# Altium footprint library ref-packages-longpad.PCBLIB: 1527 footprints (part 43 of 103) (continued)
## PQFP52 [mm]
pads (52):
  rect 1.5x0.5 smd: 1(-8.5,6) 2(-8.5,5) 3(-8.5,4) 4(-8.5,3) 5(-8.5,2) 6(-8.5,1) 7(-8.5,0) 8(-8.5,-1) 9(-8.5,-2) 10(-8.5,-3) 11(-8.5,-4) 12(-8.5,-5) 13(-8.5,-6) 27(8.5,-6) 28(8.5,-5) 29(8.5,-4) 30(8.5,-3) 31(8.5,-2) 32(8.5,-1) 33(8.5,0) 34(8.5,1) 35(8.5,2) 36(8.5,3) 37(8.5,4) 38(8.5,5) 39(8.5,6)
  rect 0.5x1.5 smd: 14(-6,-8.5) 15(-5,-8.5) 16(-4,-8.5) 17(-3,-8.5) 18(-2,-8.5) 19(-1,-8.5) 20(0,-8.5) 21(1,-8.5) 22(2,-8.5) 23(3,-8.5) 24(4,-8.5) 25(5,-8.5) 26(6,-8.5) 40(6,8.5) 41(5,8.5) 42(4,8.5) 43(3,8.5) 44(2,8.5) 45(1,8.5) 46(0,8.5) 47(-1,8.5) 48(-2,8.5) 49(-3,8.5) 50(-4,8.5) 51(-5,8.5) 52(-6,8.5)
Top Overlay:
  circle w0.152: c-6,6 r0.5
  lines w0.051: -7,-6.5 -7,6.5 -6.5,7 6.5,7 7,6.5 7,-6.5 6.5,-7 -6.5,-7 -7,-6.5
  lines w0.152: -7.5,-6.5 -7.5,6.5 -6.5,7.5 6.5,7.5 7.5,6.5 7.5,-6.5 6.5,-7.5 -6.5,-7.5 -7.5,-6.5
Mechanical 16:
  rectangle: -9.25,5.75 -7.5,6.25
  rectangle: -9.25,4.75 -7.5,5.25
  rectangle: -9.25,3.75 -7.5,4.25
  rectangle: -9.25,2.75 -7.5,3.25
  rectangle: -9.25,1.75 -7.5,2.25
  rectangle: -9.25,0.75 -7.5,1.25
  rectangle: -9.25,-0.25 -7.5,0.25
  rectangle: -9.25,-1.25 -7.5,-0.75
  rectangle: -9.25,-2.25 -7.5,-1.75
  rectangle: -9.25,-3.25 -7.5,-2.75
  rectangle: -9.25,-4.25 -7.5,-3.75
  rectangle: -9.25,-5.25 -7.5,-4.75
  rectangle: -6.25,-9.25 -5.75,-7.5
  rectangle: -5.25,-9.25 -4.75,-7.5
  rectangle: -4.25,-9.25 -3.75,-7.5
  rectangle: -3.25,-9.25 -2.75,-7.5
  rectangle: -2.25,-9.25 -1.75,-7.5
  rectangle: -1.25,-9.25 -0.75,-7.5
  rectangle: -0.25,-9.25 0.25,-7.5
  rectangle: 0.75,-9.25 1.25,-7.5
  rectangle: 1.75,-9.25 2.25,-7.5
  rectangle: 2.75,-9.25 3.25,-7.5
  rectangle: 3.75,-9.25 4.25,-7.5
  rectangle: 4.75,-9.25 5.25,-7.5
  rectangle: 5.75,-9.25 6.25,-7.5
  rectangle: 7.5,-6.25 9.25,-5.75
  rectangle: 7.5,-5.25 9.25,-4.75
  rectangle: 7.5,-4.25 9.25,-3.75
  rectangle: 7.5,-3.25 9.25,-2.75
  rectangle: 7.5,-2.25 9.25,-1.75
  rectangle: 7.5,-1.25 9.25,-0.75
  rectangle: 7.5,-0.25 9.25,0.25
  rectangle: 7.5,0.75 9.25,1.25
  rectangle: 7.5,1.75 9.25,2.25
  rectangle: 7.5,2.75 9.25,3.25
  rectangle: 7.5,3.75 9.25,4.25
  rectangle: 7.5,4.75 9.25,5.25
  rectangle: 7.5,5.75 9.25,6.25
  rectangle: 4.75,7.5 5.25,9.25
  rectangle: 5.75,7.5 6.25,9.25
  rectangle: -1.25,7.5 -0.75,9.25
  rectangle: -0.25,7.5 0.25,9.25
  rectangle: 0.75,7.5 1.25,9.25
  rectangle: 1.75,7.5 2.25,9.25
  rectangle: 2.75,7.5 3.25,9.25
  rectangle: 3.75,7.5 4.25,9.25
  rectangle: -2.25,7.5 -1.75,9.25
  rectangle: -3.25,7.5 -2.75,9.25
  rectangle: -4.25,7.5 -3.75,9.25
  rectangle: -5.25,7.5 -4.75,9.25
  rectangle: -6.25,7.5 -5.75,9.25
  rectangle: -9.25,-6.25 -7.5,-5.75

## PQFP84 [mm]
pads (84):
  rect 0.35x1.8 smd: 1(-6.35,-9.4) 2(-5.715,-9.4) 3(-5.08,-9.4) 4(-4.445,-9.4) 5(-3.81,-9.4) 6(-3.175,-9.4) 7(-2.54,-9.4) 8(-1.905,-9.4) 9(-1.27,-9.4) 10(-0.635,-9.4) 11(0,-9.4) 12(0.635,-9.4) 13(1.27,-9.4) 14(1.905,-9.4) 15(2.54,-9.4) 16(3.175,-9.4) 17(3.81,-9.4) 18(4.445,-9.4) 19(5.08,-9.4) 20(5.715,-9.4) 21(6.35,-9.4) 43(6.35,9.4) 44(5.715,9.4) 45(5.08,9.4) 46(4.445,9.4) 47(3.81,9.4) 48(3.175,9.4) 49(2.54,9.4) 50(1.905,9.4) 51(1.27,9.4) 52(0.635,9.4) 53(0,9.4) 54(-0.635,9.4) 55(-1.27,9.4) 56(-1.905,9.4) 57(-2.54,9.4) 58(-3.175,9.4) 59(-3.81,9.4) 60(-4.445,9.4) 61(-5.08,9.4) 62(-5.715,9.4) 63(-6.35,9.4)
  rect 1.8x0.35 smd: 22(9.4,-6.35) 23(9.4,-5.715) 24(9.4,-5.08) 25(9.4,-4.445) 26(9.4,-3.81) 27(9.4,-3.175) 28(9.4,-2.54) 29(9.4,-1.905) 30(9.4,-1.27) 31(9.4,-0.635) 32(9.4,0) 33(9.4,0.635) 34(9.4,1.27) 35(9.4,1.905) 36(9.4,2.54) 37(9.4,3.175) 38(9.4,3.81) 39(9.4,4.445) 40(9.4,5.08) 41(9.4,5.715) 42(9.4,6.35) 64(-9.4,6.35) 65(-9.4,5.715) 66(-9.4,5.08) 67(-9.4,4.445) 68(-9.4,3.81) 69(-9.4,3.175) 70(-9.4,2.54) 71(-9.4,1.905) 72(-9.4,1.27) 73(-9.4,0.635) 74(-9.4,0) 75(-9.4,-0.635) 76(-9.4,-1.27) 77(-9.4,-1.905) 78(-9.4,-2.54) 79(-9.4,-3.175) 80(-9.4,-3.81) 81(-9.4,-4.445) 82(-9.4,-5.08) 83(-9.4,-5.715) 84(-9.4,-6.35)
Top Overlay:
  lines w0.203: -9.92,-8.382 -9.92,-9.144 -9.144,-9.906 ; -9.92,8.382 -9.92,9.144 ; -9.906,-8.382 -8.3,-7.112 -8.3,7.112 -9.906,8.382 ; -9.906,9.144 -9.144,9.92 -8.382,9.92 ; -9.144,-9.92 -8.382,-9.92 ; -8.382,-9.906 -7.112,-8.3 -6.776,-8.3 ; -8.382,9.906 -7.112,8.3 7.112,8.3 8.382,9.906 ; 6.985,-8.255 6.985,-7.62 -6.776,-7.62 -6.776,-8.3 ; 8.382,-9.92 9.144,-9.92 9.906,-9.144 ; 8.382,-9.906 7.112,-8.3 -6.776,-8.3 ; 8.382,9.92 9.144,9.92 ; 9.144,9.906 9.92,9.144 9.92,8.382 ; 9.906,-8.382 8.3,-7.112 8.3,7.112 9.906,8.382 ; 9.92,-9.144 9.92,-8.382
  text "1" at -6.61,-7.53 h1.97
Mechanical 16:
  drawing of 168 lines, arcs and shapes, not listed
Mechanical 27:
  lines w0.2: -10.9,-10.9 -10.9,10.9 10.9,10.9 10.9,-10.9 -10.9,-10.9

## PQFP100 [mm]
pads (100):
  rect 0.35x1.8 smd: 1(-7.62,-10.7) 2(-6.985,-10.7) 3(-6.35,-10.7) 4(-5.715,-10.7) 5(-5.08,-10.7) 6(-4.445,-10.7) 7(-3.81,-10.7) 8(-3.175,-10.7) 9(-2.54,-10.7) 10(-1.905,-10.7) 11(-1.27,-10.7) 12(-0.635,-10.7) 13(0,-10.7) 14(0.635,-10.7) 15(1.27,-10.7) 16(1.905,-10.7) 17(2.54,-10.7) 18(3.175,-10.7) 19(3.81,-10.7) 20(4.445,-10.7) 21(5.08,-10.7) 22(5.715,-10.7) 23(6.35,-10.7) 24(6.985,-10.7) 25(7.62,-10.7) 51(7.62,10.7) 52(6.985,10.7) 53(6.35,10.7) 54(5.715,10.7) 55(5.08,10.7) 56(4.445,10.7) 57(3.81,10.7) 58(3.175,10.7) 59(2.54,10.7) 60(1.905,10.7) 61(1.27,10.7) 62(0.635,10.7) 63(0,10.7) 64(-0.635,10.7) 65(-1.27,10.7) 66(-1.905,10.7) 67(-2.54,10.7) 68(-3.175,10.7) 69(-3.81,10.7) 70(-4.445,10.7) 71(-5.08,10.7) 72(-5.715,10.7) 73(-6.35,10.7) 74(-6.985,10.7) 75(-7.62,10.7)
  rect 1.8x0.35 smd: 26(10.7,-7.62) 27(10.7,-6.985) 28(10.7,-6.35) 29(10.7,-5.715) 30(10.7,-5.08) 31(10.7,-4.445) 32(10.7,-3.81) 33(10.7,-3.175) 34(10.7,-2.54) 35(10.7,-1.905) 36(10.7,-1.27) 37(10.7,-0.635) 38(10.7,0) 39(10.7,0.635) 40(10.7,1.27) 41(10.7,1.905) 42(10.7,2.54) 43(10.7,3.175) 44(10.7,3.81) 45(10.7,4.445) 46(10.7,5.08) 47(10.7,5.715) 48(10.7,6.35) 49(10.7,6.985) 50(10.7,7.62) 76(-10.7,7.62) 77(-10.7,6.985) 78(-10.7,6.35) 79(-10.7,5.715) 80(-10.7,5.08) 81(-10.7,4.445) 82(-10.7,3.81) 83(-10.7,3.175) 84(-10.7,2.54) 85(-10.7,1.905) 86(-10.7,1.27) 87(-10.7,0.635) 88(-10.7,0) 89(-10.7,-0.635) 90(-10.7,-1.27) 91(-10.7,-1.905) 92(-10.7,-2.54) 93(-10.7,-3.175) 94(-10.7,-3.81) 95(-10.7,-4.445) 96(-10.7,-5.08) 97(-10.7,-5.715) 98(-10.7,-6.35) 99(-10.7,-6.985) 100(-10.7,-7.62)
Top Overlay:
  lines w0.203: -11.22,9.652 -11.22,10.414 ; -11.206,9.652 -9.6,8.382 ; -11.206,10.414 -10.444,11.19 -9.682,11.19 ; -11.19,-9.682 -11.19,-10.444 -10.414,-11.206 ; -11.176,-9.682 -9.57,-8.412 ; -10.414,-11.22 -9.652,-11.22 ; -9.682,11.176 -8.412,9.57 ; -9.652,-11.206 -8.382,-9.6 -8.046,-9.6 ; -9.6,-8.382 -9.6,8.3 ; -8.382,9.6 8.3,9.6 ; 8.255,-9.555 8.255,-8.92 -8.046,-8.92 -8.046,-9.6 ; 8.382,-9.6 -8.046,-9.6 ; 8.382,9.6 9.652,11.206 ; 8.412,-9.57 9.682,-11.176 ; 9.57,8.412 11.176,9.682 ; 9.6,-8.382 11.206,-9.652 ; 9.6,-8.3 9.6,8.382 ; 9.652,11.22 10.414,11.22 ; 9.682,-11.19 10.444,-11.19 11.206,-10.414 ; 10.414,11.206 11.19,10.444 11.19,9.682 ; 11.22,-10.414 11.22,-9.652
  text "1" at -7.88,-8.83 h1.97
Mechanical 16:
  drawing of 200 lines, arcs and shapes, not listed
Mechanical 27:
  lines w0.2: -12.4,-12.4 -12.4,12.4 12.4,12.4 12.4,-12.4 -12.4,-12.4

## PQFP128L [mil]
pads (128):
  rect 9.84x62.99 smd: 1(-364.17,-338.58) 2(-344.49,-338.58) 3(-324.8,-338.58) 4(-305.12,-338.58) 5(-285.43,-338.58) 6(-265.75,-338.58) 7(-246.06,-338.58) 8(-226.38,-338.58) 9(-206.69,-338.58) 10(-187.01,-338.58) 11(-167.32,-338.58) 12(-147.64,-338.58) 13(-127.95,-338.58) 14(-108.27,-338.58) 15(-88.58,-338.58) 16(-68.9,-338.58) 17(-49.21,-338.58) 18(-29.53,-338.58) 19(-9.84,-338.58) 20(9.84,-338.58) 21(29.53,-338.58) 22(49.21,-338.58) 23(68.9,-338.58) 24(88.58,-338.58) 25(108.27,-338.58) 26(127.95,-338.58) 27(147.64,-338.58) 28(167.32,-338.58) 29(187.01,-338.58) 30(206.69,-338.58) 31(226.38,-338.58) 32(246.06,-338.58) 33(265.75,-338.58) 34(285.43,-338.58) 35(305.12,-338.58) 36(324.8,-338.58) 37(344.49,-338.58) 38(364.17,-338.58) 65(364.17,338.58) 66(344.49,338.58) 67(324.8,338.58) 68(305.12,338.58) 69(285.43,338.58) 70(265.75,338.58) 71(246.06,338.58) 72(226.38,338.58) 73(206.69,338.58) 74(187.01,338.58) 75(167.32,338.58) 76(147.64,338.58) 77(127.95,338.58) 78(108.27,338.58) 79(88.58,338.58) 80(68.9,338.58) 81(49.21,338.58) 82(29.53,338.58) 83(9.84,338.58) 84(-9.84,338.58) 85(-29.53,338.58) 86(-49.21,338.58) 87(-68.9,338.58) 88(-88.58,338.58) 89(-108.27,338.58) 90(-127.95,338.58) 91(-147.64,338.58) 92(-167.32,338.58) 93(-187.01,338.58) 94(-206.69,338.58) 95(-226.38,338.58) 96(-246.06,338.58) 97(-265.75,338.58) 98(-285.43,338.58) 99(-305.12,338.58) 100(-324.8,338.58) 101(-344.49,338.58) 102(-364.17,338.58)
  rect 62.99x9.84 smd: 39(456.69,-246.06) 40(456.69,-226.38) 41(456.69,-206.69) 42(456.69,-187.01) 43(456.69,-167.32) 44(456.69,-147.64) 45(456.69,-127.95) 46(456.69,-108.27) 47(456.69,-88.58) 48(456.69,-68.9) 49(456.69,-49.21) 50(456.69,-29.53) 51(456.69,-9.84) 52(456.69,9.84) 53(456.69,29.53) 54(456.69,49.21) 55(456.69,68.9) 56(456.69,88.58) 57(456.69,108.27) 58(456.69,127.95) 59(456.69,147.64) 60(456.69,167.32) 61(456.69,187.01) 62(456.69,206.69) 63(456.69,226.38) 64(456.69,246.06) 103(-456.69,246.06) 104(-456.69,226.38) 105(-456.69,206.69) 106(-456.69,187.01) 107(-456.69,167.32) 108(-456.69,147.64) 109(-456.69,127.95) 110(-456.69,108.27) 111(-456.69,88.58) 112(-456.69,68.9) 113(-456.69,49.21) 114(-456.69,29.53) 115(-456.69,9.84) 116(-456.69,-9.84) 117(-456.69,-29.53) 118(-456.69,-49.21) 119(-456.69,-68.9) 120(-456.69,-88.58) 121(-456.69,-108.27) 122(-456.69,-127.95) 123(-456.69,-147.64) 124(-456.69,-167.32) 125(-456.69,-187.01) 126(-456.69,-206.69) 127(-456.69,-226.38) 128(-456.69,-246.06)
Top Overlay:
  circle w10: c-336.61,-212.6 r29.52
  lines w8: -376.77,-258.27 376.38,-258.27 376.38,258.27 -376.77,258.27 -376.77,-258.27
Mechanical 16:
  rectangle: -368.11,-352.36 -360.24,-273.62
  rectangle: -348.43,-352.36 -340.55,-273.62
  rectangle: -328.74,-352.36 -320.87,-273.62
  rectangle: -309.06,-352.36 -301.18,-273.62
  rectangle: -289.37,-352.36 -281.5,-273.62
  rectangle: -269.69,-352.36 -261.81,-273.62
  rectangle: -250,-352.36 -242.13,-273.62
  rectangle: -230.32,-352.36 -222.44,-273.62
  rectangle: -210.63,-352.36 -202.76,-273.62
  rectangle: -190.94,-352.36 -183.07,-273.62
  rectangle: -171.26,-352.36 -163.39,-273.62
  rectangle: -151.57,-352.36 -143.7,-273.62
  rectangle: -131.89,-352.36 -124.02,-273.62
  rectangle: -112.2,-352.36 -104.33,-273.62
  rectangle: -92.52,-352.36 -84.65,-273.62
  rectangle: -72.83,-352.36 -64.96,-273.62
  rectangle: -53.15,-352.36 -45.28,-273.62
  rectangle: -33.46,-352.36 -25.59,-273.62
  rectangle: -13.78,-352.36 -5.91,-273.62
  rectangle: 5.91,-352.36 13.78,-273.62
  rectangle: 25.59,-352.36 33.46,-273.62
  rectangle: 45.28,-352.36 53.15,-273.62
  rectangle: 64.96,-352.36 72.83,-273.62
  rectangle: 84.65,-352.36 92.52,-273.62
  rectangle: 104.33,-352.36 112.2,-273.62
  rectangle: 124.02,-352.36 131.89,-273.62
  rectangle: 143.7,-352.36 151.57,-273.62
  rectangle: 163.39,-352.36 171.26,-273.62
  rectangle: 183.07,-352.36 190.94,-273.62
  rectangle: 202.76,-352.36 210.63,-273.62
  rectangle: 222.44,-352.36 230.32,-273.62
  rectangle: 242.13,-352.36 250,-273.62
  rectangle: 261.81,-352.36 269.69,-273.62
  rectangle: 281.5,-352.36 289.37,-273.62
  rectangle: 301.18,-352.36 309.06,-273.62
  rectangle: 320.87,-352.36 328.74,-273.62
  rectangle: 340.55,-352.36 348.43,-273.62
  rectangle: 360.24,-352.36 368.11,-273.62
  rectangle: 391.73,-250 470.47,-242.13
  rectangle: 391.73,-230.32 470.47,-222.44
  rectangle: 391.73,-210.63 470.47,-202.76
  rectangle: 391.73,-190.94 470.47,-183.07
  rectangle: 391.73,-171.26 470.47,-163.39
  rectangle: 391.73,-151.57 470.47,-143.7
  rectangle: 391.73,-131.89 470.47,-124.02
  rectangle: 391.73,-112.2 470.47,-104.33
  rectangle: 391.73,-92.52 470.47,-84.65
  rectangle: 391.73,-72.83 470.47,-64.96
  rectangle: 391.73,-53.15 470.47,-45.28
  rectangle: 391.73,-33.46 470.47,-25.59
  rectangle: 391.73,-13.78 470.47,-5.91
  rectangle: 391.73,5.91 470.47,13.78
  rectangle: 391.73,25.59 470.47,33.46
  rectangle: 391.73,45.28 470.47,53.15
  rectangle: 391.73,64.96 470.47,72.83
  rectangle: 391.73,84.65 470.47,92.52
  rectangle: 391.73,104.33 470.47,112.2
  rectangle: 391.73,124.02 470.47,131.89
  rectangle: 391.73,143.7 470.47,151.57
  rectangle: 391.73,163.39 470.47,171.26
  rectangle: 391.73,183.07 470.47,190.94
  rectangle: 391.73,202.76 470.47,210.63
  rectangle: 391.73,222.44 470.47,230.32
  rectangle: 391.73,242.13 470.47,250
  rectangle: 360.24,273.62 368.11,352.36
  rectangle: 340.55,273.62 348.43,352.36
  rectangle: 320.87,273.62 328.74,352.36
  rectangle: 301.18,273.62 309.06,352.36
  rectangle: 281.5,273.62 289.37,352.36
  rectangle: 261.81,273.62 269.69,352.36
  rectangle: 242.13,273.62 250,352.36
  rectangle: 222.44,273.62 230.32,352.36
  rectangle: 202.76,273.62 210.63,352.36
  rectangle: 183.07,273.62 190.94,352.36
  rectangle: 163.39,273.62 171.26,352.36
  rectangle: 143.7,273.62 151.57,352.36
  rectangle: 124.02,273.62 131.89,352.36
  rectangle: 104.33,273.62 112.2,352.36
  rectangle: 84.65,273.62 92.52,352.36
  rectangle: 64.96,273.62 72.83,352.36
  rectangle: 45.28,273.62 53.15,352.36
  rectangle: 25.59,273.62 33.46,352.36
  rectangle: 5.91,273.62 13.78,352.36
  rectangle: -13.78,273.62 -5.91,352.36
  rectangle: -33.46,273.62 -25.59,352.36
  rectangle: -53.15,273.62 -45.28,352.36
  rectangle: -72.83,273.62 -64.96,352.36
  rectangle: -92.52,273.62 -84.65,352.36
  rectangle: -112.2,273.62 -104.33,352.36
  rectangle: -131.89,273.62 -124.02,352.36
  rectangle: -151.57,273.62 -143.7,352.36
  rectangle: -171.26,273.62 -163.39,352.36
  rectangle: -190.94,273.62 -183.07,352.36
  rectangle: -210.63,273.62 -202.76,352.36
  rectangle: -230.32,273.62 -222.44,352.36
  rectangle: -250,273.62 -242.13,352.36
  rectangle: -269.69,273.62 -261.81,352.36
  rectangle: -289.37,273.62 -281.5,352.36
  rectangle: -309.06,273.62 -301.18,352.36
  rectangle: -328.74,273.62 -320.87,352.36
  rectangle: -348.43,273.62 -340.55,352.36
  rectangle: -368.11,273.62 -360.24,352.36
  rectangle: -470.47,242.13 -391.73,250
  rectangle: -470.47,222.44 -391.73,230.32
  rectangle: -470.47,202.76 -391.73,210.63
  rectangle: -470.47,183.07 -391.73,190.94
  rectangle: -470.47,163.39 -391.73,171.26
  rectangle: -470.47,143.7 -391.73,151.57
  rectangle: -470.47,124.02 -391.73,131.89
  rectangle: -470.47,104.33 -391.73,112.2
  rectangle: -470.47,84.65 -391.73,92.52
  rectangle: -470.47,64.96 -391.73,72.83
  rectangle: -470.47,45.28 -391.73,53.15
  rectangle: -470.47,25.59 -391.73,33.46
  rectangle: -470.47,5.91 -391.73,13.78
  rectangle: -470.47,-13.78 -391.73,-5.91
  rectangle: -470.47,-33.46 -391.73,-25.59
  rectangle: -470.47,-53.15 -391.73,-45.28
  rectangle: -470.47,-72.83 -391.73,-64.96
  rectangle: -470.47,-92.52 -391.73,-84.65
  rectangle: -470.47,-112.2 -391.73,-104.33
  rectangle: -470.47,-131.89 -391.73,-124.02
  rectangle: -470.47,-151.57 -391.73,-143.7
  rectangle: -470.47,-171.26 -391.73,-163.39
  rectangle: -470.47,-190.94 -391.73,-183.07
  rectangle: -470.47,-210.63 -391.73,-202.76
  rectangle: -470.47,-230.32 -391.73,-222.44
  rectangle: -470.47,-250 -391.73,-242.13
  lines w8: -389.76,-271.65 389.76,-271.65 389.76,271.65 -389.76,271.65 -389.76,-271.65

## PQFP132 [mm]
pads (132):
  rect 0.35x1.8 smd: 1(-10.16,-13.2) 2(-9.525,-13.2) 3(-8.89,-13.2) 4(-8.255,-13.2) 5(-7.62,-13.2) 6(-6.985,-13.2) 7(-6.35,-13.2) 8(-5.715,-13.2) 9(-5.08,-13.2) 10(-4.445,-13.2) 11(-3.81,-13.2) 12(-3.175,-13.2) 13(-2.54,-13.2) 14(-1.905,-13.2) 15(-1.27,-13.2) 16(-0.635,-13.2) 17(0,-13.2) 18(0.635,-13.2) 19(1.27,-13.2) 20(1.905,-13.2) 21(2.54,-13.2) 22(3.175,-13.2) 23(3.81,-13.2) 24(4.445,-13.2) 25(5.08,-13.2) 26(5.715,-13.2) 27(6.35,-13.2) 28(6.985,-13.2) 29(7.62,-13.2) 30(8.255,-13.2) 31(8.89,-13.2) 32(9.525,-13.2) 33(10.16,-13.2) 67(10.16,13.2) 68(9.525,13.2) 69(8.89,13.2) 70(8.255,13.2) 71(7.62,13.2) 72(6.985,13.2) 73(6.35,13.2) 74(5.715,13.2) 75(5.08,13.2) 76(4.445,13.2) 77(3.81,13.2) 78(3.175,13.2) 79(2.54,13.2) 80(1.905,13.2) 81(1.27,13.2) 82(0.635,13.2) 83(0,13.2) 84(-0.635,13.2) 85(-1.27,13.2) 86(-1.905,13.2) 87(-2.54,13.2) 88(-3.175,13.2) 89(-3.81,13.2) 90(-4.445,13.2) 91(-5.08,13.2) 92(-5.715,13.2) 93(-6.35,13.2) 94(-6.985,13.2) 95(-7.62,13.2) 96(-8.255,13.2) 97(-8.89,13.2) 98(-9.525,13.2) 99(-10.16,13.2)
  rect 1.8x0.35 smd: 34(13.2,-10.16) 35(13.2,-9.525) 36(13.2,-8.89) 37(13.2,-8.255) 38(13.2,-7.62) 39(13.2,-6.985) 40(13.2,-6.35) 41(13.2,-5.715) 42(13.2,-5.08) 43(13.2,-4.445) 44(13.2,-3.81) 45(13.2,-3.175) 46(13.2,-2.54) 47(13.2,-1.905) 48(13.2,-1.27) 49(13.2,-0.635) 50(13.2,0) 51(13.2,0.635) 52(13.2,1.27) 53(13.2,1.905) 54(13.2,2.54) 55(13.2,3.175) 56(13.2,3.81) 57(13.2,4.445) 58(13.2,5.08) 59(13.2,5.715) 60(13.2,6.35) 61(13.2,6.985) 62(13.2,7.62) 63(13.2,8.255) 64(13.2,8.89) 65(13.2,9.525) 66(13.2,10.16) 100(-13.2,10.16) 101(-13.2,9.525) 102(-13.2,8.89) 103(-13.2,8.255) 104(-13.2,7.62) 105(-13.2,6.985) 106(-13.2,6.35) 107(-13.2,5.715) 108(-13.2,5.08) 109(-13.2,4.445) 110(-13.2,3.81) 111(-13.2,3.175) 112(-13.2,2.54) 113(-13.2,1.905) 114(-13.2,1.27) 115(-13.2,0.635) 116(-13.2,0) 117(-13.2,-0.635) 118(-13.2,-1.27) 119(-13.2,-1.905) 120(-13.2,-2.54) 121(-13.2,-3.175) 122(-13.2,-3.81) 123(-13.2,-4.445) 124(-13.2,-5.08) 125(-13.2,-5.715) 126(-13.2,-6.35) 127(-13.2,-6.985) 128(-13.2,-7.62) 129(-13.2,-8.255) 130(-13.2,-8.89) 131(-13.2,-9.525) 132(-13.2,-10.16)
Top Overlay:
  lines w0.203: -13.76,12.152 -13.76,12.914 ; -13.746,12.152 -12.14,10.882 ; -13.746,12.914 -12.984,13.69 -12.222,13.69 ; -13.73,-12.182 -13.73,-12.944 -12.954,-13.706 ; -13.716,-12.182 -12.11,-10.912 ; -12.954,-13.72 -12.192,-13.72 ; -12.222,13.676 -10.952,12.07 ; -12.192,-13.706 -10.922,-12.1 -10.586,-12.1 ; -12.14,-10.962 -12.14,10.8 ; -10.962,12.14 10.8,12.14 ; 10.795,-12.055 10.795,-11.42 -10.586,-11.42 -10.586,-12.1 ; 10.882,12.14 12.152,13.746 ; 10.922,-12.1 -10.586,-12.1 ; 10.952,-12.07 12.222,-13.676 ; 12.07,10.952 13.676,12.222 ; 12.14,-10.882 13.746,-12.152 ; 12.14,-10.8 12.14,10.962 ; 12.152,13.76 12.914,13.76 ; 12.222,-13.69 12.984,-13.69 13.746,-12.914 ; 12.914,13.746 13.69,12.984 13.69,12.222 ; 13.76,-12.914 13.76,-12.152
  text "1" at -10.42,-11.33 h1.97
Mechanical 16:
  drawing of 264 lines, arcs and shapes, not listed
Mechanical 27:
  lines w0.2: -14.4,-14.4 -14.4,14.4 14.4,14.4 14.4,-14.4 -14.4,-14.4

## PQFP144 [mm]
pads (144):
  rect 1.2x0.35 smd: 1(-10.75,8.75) 2(-10.75,8.25) 3(-10.75,7.75) 4(-10.75,7.25) 5(-10.75,6.75) 6(-10.75,6.25) 7(-10.75,5.75) 8(-10.75,5.25) 9(-10.75,4.75) 10(-10.75,4.25) 11(-10.75,3.75) 12(-10.75,3.25) 13(-10.75,2.75) 14(-10.75,2.25) 15(-10.75,1.75) 16(-10.75,1.25) 17(-10.75,0.75) 18(-10.75,0.25) 19(-10.75,-0.25) 20(-10.75,-0.75) 21(-10.75,-1.25) 22(-10.75,-1.75) 23(-10.75,-2.25) 24(-10.75,-2.75) 25(-10.75,-3.25) 26(-10.75,-3.75) 27(-10.75,-4.25) 28(-10.75,-4.75) 29(-10.75,-5.25) 30(-10.75,-5.75) 31(-10.75,-6.25) 32(-10.75,-6.75) 33(-10.75,-7.25) 34(-10.75,-7.75) 35(-10.75,-8.25) 36(-10.75,-8.75) 73(10.75,-8.75) 74(10.75,-8.25) 75(10.75,-7.75) 76(10.75,-7.25) 77(10.75,-6.75) 78(10.75,-6.25) 79(10.75,-5.75) 80(10.75,-5.25) 81(10.75,-4.75) 82(10.75,-4.25) 83(10.75,-3.75) 84(10.75,-3.25) 85(10.75,-2.75) 86(10.75,-2.25) 87(10.75,-1.75) 88(10.75,-1.25) 89(10.75,-0.75) 90(10.75,-0.25) 91(10.75,0.25) 92(10.75,0.75) 93(10.75,1.25) 94(10.75,1.75) 95(10.75,2.25) 96(10.75,2.75) 97(10.75,3.25) 98(10.75,3.75) 99(10.75,4.25) 100(10.75,4.75) 101(10.75,5.25) 102(10.75,5.75) 103(10.75,6.25) 104(10.75,6.75) 105(10.75,7.25) 106(10.75,7.75) 107(10.75,8.25) 108(10.75,8.75)
  rect 0.35x1.2 smd: 37(-8.75,-10.75) 38(-8.25,-10.75) 39(-7.75,-10.75) 40(-7.25,-10.75) 41(-6.75,-10.75) 42(-6.25,-10.75) 43(-5.75,-10.75) 44(-5.25,-10.75) 45(-4.75,-10.75) 46(-4.25,-10.75) 47(-3.75,-10.75) 48(-3.25,-10.75) 49(-2.75,-10.75) 50(-2.25,-10.75) 51(-1.75,-10.75) 52(-1.25,-10.75) 53(-0.75,-10.75) 54(-0.25,-10.75) 55(0.25,-10.75) 56(0.75,-10.75) 57(1.25,-10.75) 58(1.75,-10.75) 59(2.25,-10.75) 60(2.75,-10.75) 61(3.25,-10.75) 62(3.75,-10.75) 63(4.25,-10.75) 64(4.75,-10.75) 65(5.25,-10.75) 66(5.75,-10.75) 67(6.25,-10.75) 68(6.75,-10.75) 69(7.25,-10.75) 70(7.75,-10.75) 71(8.25,-10.75) 72(8.75,-10.75) 109(8.75,10.75) 110(8.25,10.75) 111(7.75,10.75) 112(7.25,10.75) 113(6.75,10.75) 114(6.25,10.75) 115(5.75,10.75) 116(5.25,10.75) 117(4.75,10.75) 118(4.25,10.75) 119(3.75,10.75) 120(3.25,10.75) 121(2.75,10.75) 122(2.25,10.75) 123(1.75,10.75) 124(1.25,10.75) 125(0.75,10.75) 126(0.25,10.75) 127(-0.25,10.75) 128(-0.75,10.75) 129(-1.25,10.75) 130(-1.75,10.75) 131(-2.25,10.75) 132(-2.75,10.75) 133(-3.25,10.75) 134(-3.75,10.75) 135(-4.25,10.75) 136(-4.75,10.75) 137(-5.25,10.75) 138(-5.75,10.75) 139(-6.25,10.75) 140(-6.75,10.75) 141(-7.25,10.75) 142(-7.75,10.75) 143(-8.25,10.75) 144(-8.75,10.75)
Top Overlay:
  circle w0.254: c-8.75,8.75 r0.25
  lines w0.254: -9.75,-9.5 -9.5,-9.75 9.5,-9.75 9.75,-9.5 9.75,9.5 9.5,9.75 -9,9.75 -9.75,9 -9.75,-9.5
Mechanical 16:
  rectangle: -10.95,8.6 -9.9,8.9
  rectangle: -10.95,8.1 -9.9,8.4
  rectangle: -10.95,7.6 -9.9,7.9
  rectangle: -10.95,7.1 -9.9,7.4
  rectangle: -10.95,6.6 -9.9,6.9
  rectangle: -10.95,6.1 -9.9,6.4
  rectangle: -10.95,5.6 -9.9,5.9
  rectangle: -10.95,5.1 -9.9,5.4
  rectangle: -10.95,4.6 -9.9,4.9
  rectangle: -10.95,4.1 -9.9,4.4
  rectangle: -10.95,3.6 -9.9,3.9
  rectangle: -10.95,3.1 -9.9,3.4
  rectangle: -10.95,2.6 -9.9,2.9
  rectangle: -10.95,2.1 -9.9,2.4
  rectangle: -10.95,1.6 -9.9,1.9
  rectangle: -10.95,1.1 -9.9,1.4
  rectangle: -10.95,0.6 -9.9,0.9
  rectangle: -10.95,0.1 -9.9,0.4
  rectangle: -10.95,-0.4 -9.9,-0.1
  rectangle: -10.95,-0.9 -9.9,-0.6
  rectangle: -10.95,-1.4 -9.9,-1.1
  rectangle: -10.95,-1.9 -9.9,-1.6
  rectangle: -10.95,-2.4 -9.9,-2.1
  rectangle: -10.95,-2.9 -9.9,-2.6
  rectangle: -10.95,-3.4 -9.9,-3.1
  rectangle: -10.95,-3.9 -9.9,-3.6
  rectangle: -10.95,-4.4 -9.9,-4.1
  rectangle: -10.95,-4.9 -9.9,-4.6
  rectangle: -10.95,-5.4 -9.9,-5.1
  rectangle: -10.95,-5.9 -9.9,-5.6
  rectangle: -10.95,-6.4 -9.9,-6.1
  rectangle: -10.95,-6.9 -9.9,-6.6
  rectangle: -10.95,-7.4 -9.9,-7.1
  rectangle: -10.95,-7.9 -9.9,-7.6
  rectangle: -10.95,-8.4 -9.9,-8.1
  rectangle: -10.95,-8.9 -9.9,-8.6
  rectangle: -8.9,-10.95 -8.6,-9.9
  rectangle: -8.4,-10.95 -8.1,-9.9
  rectangle: -7.9,-10.95 -7.6,-9.9
  rectangle: -7.4,-10.95 -7.1,-9.9
  rectangle: -6.9,-10.95 -6.6,-9.9
  rectangle: -6.4,-10.95 -6.1,-9.9
  rectangle: -5.9,-10.95 -5.6,-9.9
  rectangle: -5.4,-10.95 -5.1,-9.9
  rectangle: -4.9,-10.95 -4.6,-9.9
  rectangle: -4.4,-10.95 -4.1,-9.9
  rectangle: -3.9,-10.95 -3.6,-9.9
  rectangle: -3.4,-10.95 -3.1,-9.9
  rectangle: -2.9,-10.95 -2.6,-9.9
  rectangle: -2.4,-10.95 -2.1,-9.9
  rectangle: -1.9,-10.95 -1.6,-9.9
  rectangle: -1.4,-10.95 -1.1,-9.9
  rectangle: -0.9,-10.95 -0.6,-9.9
  rectangle: -0.4,-10.95 -0.1,-9.9
  rectangle: 0.1,-10.95 0.4,-9.9
  rectangle: 0.6,-10.95 0.9,-9.9
  rectangle: 1.1,-10.95 1.4,-9.9
  rectangle: 1.6,-10.95 1.9,-9.9
  rectangle: 2.1,-10.95 2.4,-9.9
  rectangle: 2.6,-10.95 2.9,-9.9
  rectangle: 3.1,-10.95 3.4,-9.9
  rectangle: 3.6,-10.95 3.9,-9.9
  rectangle: 4.1,-10.95 4.4,-9.9
  rectangle: 4.6,-10.95 4.9,-9.9
  rectangle: 5.1,-10.95 5.4,-9.9
  rectangle: 5.6,-10.95 5.9,-9.9
  rectangle: 6.1,-10.95 6.4,-9.9
  rectangle: 6.6,-10.95 6.9,-9.9
  rectangle: 7.1,-10.95 7.4,-9.9
  rectangle: 7.6,-10.95 7.9,-9.9
  rectangle: 8.1,-10.95 8.4,-9.9
  rectangle: 8.6,-10.95 8.9,-9.9
  rectangle: 9.9,-8.9 10.95,-8.6
  rectangle: 9.9,-8.4 10.95,-8.1
  rectangle: 9.9,-7.9 10.95,-7.6
  rectangle: 9.9,-7.4 10.95,-7.1
  rectangle: 9.9,-6.9 10.95,-6.6
  rectangle: 9.9,-6.4 10.95,-6.1
  rectangle: 9.9,-5.9 10.95,-5.6
  rectangle: 9.9,-5.4 10.95,-5.1
  rectangle: 9.9,-4.9 10.95,-4.6
  rectangle: 9.9,-4.4 10.95,-4.1
  rectangle: 9.9,-3.9 10.95,-3.6
  rectangle: 9.9,-3.4 10.95,-3.1
  rectangle: 9.9,-2.9 10.95,-2.6
  rectangle: 9.9,-2.4 10.95,-2.1
  rectangle: 9.9,-1.9 10.95,-1.6
  rectangle: 9.9,-1.4 10.95,-1.1
  rectangle: 9.9,-0.9 10.95,-0.6
  rectangle: 9.9,-0.4 10.95,-0.1
  rectangle: 9.9,0.1 10.95,0.4
  rectangle: 9.9,0.6 10.95,0.9
  rectangle: 9.9,1.1 10.95,1.4
  rectangle: 9.9,1.6 10.95,1.9
  rectangle: 9.9,2.1 10.95,2.4
  rectangle: 9.9,2.6 10.95,2.9
  rectangle: 9.9,3.1 10.95,3.4
  rectangle: 9.9,3.6 10.95,3.9
  rectangle: 9.9,4.1 10.95,4.4
  rectangle: 9.9,4.6 10.95,4.9
  rectangle: 9.9,5.1 10.95,5.4
  rectangle: 9.9,5.6 10.95,5.9
  rectangle: 9.9,6.1 10.95,6.4
  rectangle: 9.9,6.6 10.95,6.9
  rectangle: 9.9,7.1 10.95,7.4
  rectangle: 9.9,7.6 10.95,7.9
  rectangle: 9.9,8.1 10.95,8.4
  rectangle: 9.9,8.6 10.95,8.9
  rectangle: 8.6,9.9 8.9,10.95
  rectangle: 8.1,9.9 8.4,10.95
  rectangle: 7.6,9.9 7.9,10.95
  rectangle: 7.1,9.9 7.4,10.95
  rectangle: 6.6,9.9 6.9,10.95
  rectangle: 6.1,9.9 6.4,10.95
  rectangle: 5.6,9.9 5.9,10.95
  rectangle: 5.1,9.9 5.4,10.95
  rectangle: 4.6,9.9 4.9,10.95
  rectangle: 4.1,9.9 4.4,10.95
  rectangle: 3.6,9.9 3.9,10.95
  rectangle: 3.1,9.9 3.4,10.95
  rectangle: 2.6,9.9 2.9,10.95
  rectangle: 2.1,9.9 2.4,10.95
  rectangle: 1.6,9.9 1.9,10.95
  rectangle: 1.1,9.9 1.4,10.95
  rectangle: 0.6,9.9 0.9,10.95
  rectangle: 0.1,9.9 0.4,10.95
  rectangle: -0.4,9.9 -0.1,10.95
  rectangle: -0.9,9.9 -0.6,10.95
  rectangle: -1.4,9.9 -1.1,10.95
  rectangle: -1.9,9.9 -1.6,10.95
  rectangle: -2.4,9.9 -2.1,10.95
  rectangle: -2.9,9.9 -2.6,10.95
  rectangle: -3.4,9.9 -3.1,10.95
  rectangle: -3.9,9.9 -3.6,10.95
  rectangle: -4.4,9.9 -4.1,10.95
  rectangle: -4.9,9.9 -4.6,10.95
  rectangle: -5.4,9.9 -5.1,10.95
  rectangle: -5.9,9.9 -5.6,10.95
  rectangle: -6.4,9.9 -6.1,10.95
  rectangle: -6.9,9.9 -6.6,10.95
  rectangle: -7.4,9.9 -7.1,10.95
  rectangle: -7.9,9.9 -7.6,10.95
  rectangle: -8.4,9.9 -8.1,10.95
  rectangle: -8.9,9.9 -8.6,10.95
  text "PGE(S-PQFP-G144)" at -3.81,-8.23 h0.94